# Altium footprint library mastermind.PCBLIB: 1061 footprints (part 44 of 67)
Each footprint in its own frame and in the unit in brackets; x right, y up, seen from the top. Pads: shape width x height; smd on the part's side, far side on the other; paste and mask are expansions set on the pad; w line width, h text height; cw(c..) or ccw(c..) is an arc to the next point about the centre after c.
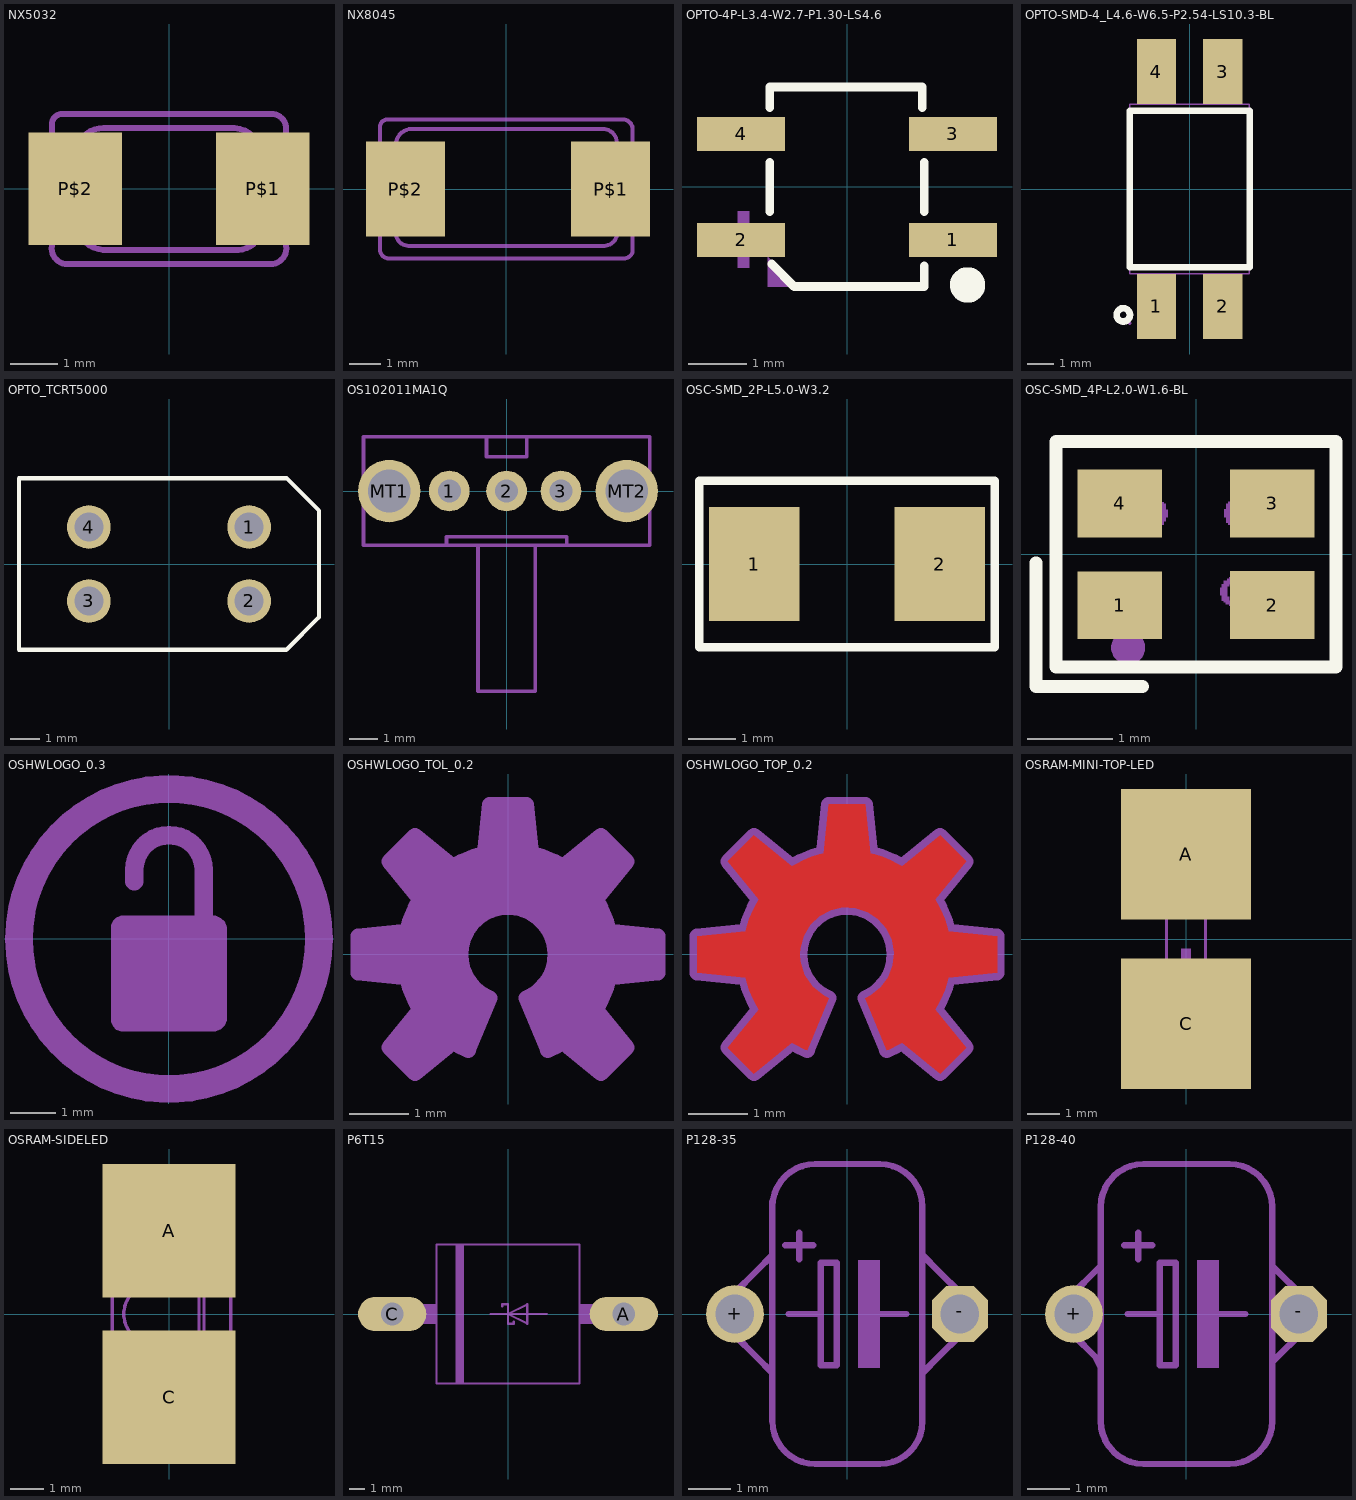
[diagram p43: the footprints below, top view; thin cyan lines are the x and y axes]

## NX5032 [mm]
pads (2):
  rect 2x2.4 smd: P$1(2,0) P$2(-2,0)
Mechanical 2:
  lines w0.127: -2.5,-1.217 ccw(c-2.167,-1.267) -2.217,-1.6 2.217,-1.6 ccw(c2.167,-1.267) 2.5,-1.217 2.5,1.284 ccw(c2.184,1.284) 2.184,1.6 -2.276,1.6 ccw(c-2.276,1.376) -2.5,1.376 -2.5,-1.217 ; -2,-0.7 ccw(c-1.35,-0.65) -1.3,-1.3 1.4,-1.3 ccw(c1.45,-0.75) 2,-0.8 2,0.6 ccw(c1.35,0.65) 1.4,1.3 -1.4,1.3 ccw(c-1.4,0.7) -2,0.7 -2,-0.7

## NX8045 [mm]
pads (2):
  rect 2.5x3 smd: P$1(3.3,0) P$2(-3.2,0)
Mechanical 2:
  lines w0.127: -4,-1.917 ccw(c-3.717,-1.917) -3.717,-2.2 3.717,-2.2 ccw(c3.717,-1.917) 4,-1.917 4,1.884 ccw(c3.684,1.884) 3.684,2.2 -3.776,2.2 ccw(c-3.776,1.976) -4,1.976 -4,-1.917 ; -3.5,-1.4 ccw(c-3.1,-1.4) -3.1,-1.8 3.1,-1.8 ccw(c3.1,-1.4) 3.5,-1.4 3.5,1.4 ccw(c3.05,1.45) 3.1,1.9 -3,1.9 ccw(c-3,1.4) -3.5,1.4 -3.5,-1.4

## OPTO-4P-L3.4-W2.7-P1.30-LS4.6 [mm]
pads (4):
  rect 1.5x0.58 smd paste+0 mask+0.051: 1(1.8,-0.9) 2(-1.8,-0.9) 3(1.8,0.9) 4(-1.8,0.9)
Top Overlay:
  lines w0.15: -1.312,-0.416 -1.312,0.416 ; -1.312,1.344 -1.312,1.696 1.28,1.696 1.28,1.344 ; -1.28,-1.312 -0.896,-1.696 -0.8,-1.696 1.312,-1.696 1.312,-1.344 ; 1.312,-0.416 1.312,0.416
  lines w0.4: 2.048,-1.568 ccw(c2.049,-1.668) 2.051,-1.568
Mechanical 15:
  region: -1.344,-1.184 -1.344,-1.696 -0.832,-1.696
  region: 1.36,-0.8 1.36,-0.992 2.32,-0.992 2.32,-0.8
  region: -1.856,-1.376 -1.664,-1.376 -1.664,-0.416 -1.856,-0.416
  region: -2.24,-0.8 -2.24,-0.992 -1.28,-0.992 -1.28,-0.8

## OPTO-SMD-4_L4.6-W6.5-P2.54-LS10.3-BL [mm]
pads (4):
  rect 1.5x2.5 smd paste+0 mask+0.051: 1(-1.27,-4.5) 2(1.27,-4.5) 3(1.27,4.5) 4(-1.27,4.5)
Top Overlay:
  circle w0.254: c-2.54,-4.826 r0.254
  lines w0.254: -2.3,-3 2.3,-3 2.3,3 -2.3,3 -2.3,-3
Mechanical 6:
  circle w0.6: c-1.397,-4.969 r0.3
Mechanical 15:
  region: -1.995,-5.15 -1.995,-4.55 -0.545,-4.55 -0.545,-5.15
  region: -1.995,-4.56 -1.995,-3.24 -0.545,-3.24 -0.545,-4.56
  region: 0.545,-5.15 0.545,-4.55 1.995,-4.55 1.995,-5.15
  region: 0.545,-4.56 0.545,-3.24 1.995,-3.24 1.995,-4.56
  region: 0.545,4.55 0.545,5.15 1.995,5.15 1.995,4.55
  region: 0.545,3.24 0.545,4.56 1.995,4.56 1.995,3.24
  region: -1.995,4.55 -1.995,5.15 -0.545,5.15 -0.545,4.55
  region: -1.995,3.24 -1.995,4.56 -0.545,4.56 -0.545,3.24
  region: -2.23,-5.15 -2.231,-5.126 -2.266,-5.091 -2.315,-5.091 -2.35,-5.126 -2.35,-5.15 -2.349,-5.175 -2.314,-5.209 -2.266,-5.209 -2.231,-5.175
  lines w0.051: -2.29,-3.25 2.29,-3.25 2.29,3.25 -2.29,3.25 -2.29,-3.25
3D body "PC817S.STEP": height 3.75, standoff 0.12, extent -2.3,-5.089 2.3,5.089

## OPTO_TCRT5000 [mm]
pads (4):
  round 1.5 hole 1: 1(2.75,1.27) 2(2.75,-1.27) 3(-2.75,-1.27) 4(-2.75,1.27)
Top Overlay:
  lines w0.152: -5.15,-2.95 4.023,-2.95 5.15,-1.823 5.15,1.835 4.035,2.95 -5.15,2.95 -5.15,-2.95

## OS102011MA1Q [mil]
pads (5):
  round 56 hole 31.5: 1(-78.74,0) 2(0,0) 3(74.8,0)
  round 86 hole 59.06: MT1(-161.42,0) MT2(165.35,0)
Mechanical 2:
  lines w5: -82.68,-74.8 -39.37,-74.8 ; -82.68,-74.8 -196.85,-74.8 -196.85,74.8 -27.56,74.8 ; -82.68,-74.8 -82.68,-62.99 82.68,-62.99 82.68,-74.8 ; -39.37,-74.8 39.37,-74.8 ; -39.37,-74.8 -39.37,-275.59 39.37,-275.59 39.37,-74.8 ; -27.56,74.8 27.56,74.8 ; -27.56,74.8 -27.56,47.24 27.56,47.24 27.56,74.8 ; 27.56,74.8 196.85,74.8 196.85,-74.8 82.68,-74.8 ; 39.37,-74.8 82.68,-74.8

## OSC-SMD_2P-L5.0-W3.2 [mm]
pads (2):
  rect 1.9x2.4 smd paste+0 mask+0.051: 1(-1.95,0) 2(1.95,0)
Top Overlay:
  lines w0.18: -3.099,-1.75 3.099,-1.75 3.099,1.75 -3.099,1.75 -3.099,1.4 -3.099,-1.75

## OSC-SMD_4P-L2.0-W1.6-BL [mm]
pads (4):
  rect 1x0.8 smd: 1(-0.9,-0.6) 2(0.9,-0.6) 3(0.9,0.6) 4(-0.9,0.6)
Top Overlay:
  lines w0.152: -1.887,-0.1 -1.887,-1.557 -0.63,-1.557 ; -1.651,-1.328 -1.529,-1.328 1.651,-1.328 1.651,1.328 -1.651,1.328 -1.651,-1.328
Mechanical 15:
  drawing of 242 lines, arcs and shapes, not listed

## OSHWLOGO_0.3 [mm]
Mechanical 8:
  circle w0.61: c0,0 r3.302
  region: 1.27,-1.727 1.27,-1.788 1.224,-1.9 1.138,-1.986 1.026,-2.032 0.965,-2.032 -1.016,-2.032 -1.067,-2.032 -1.16,-1.993 -1.231,-1.922 -1.27,-1.829 -1.27,-1.778 -1.27,0.254 -1.27,0.305 -1.231,0.398 -1.16,0.469 -1.067,0.508 -1.016,0.508 0.965,0.508 1.026,0.508 1.138,0.462 1.224,0.376 1.27,0.264 1.27,0.203
  lines w0.406: -0.762,1.27 -0.762,1.524 cw(c0,1.524) 0,2.286 cw(c0,1.524) 0.762,1.524 0.762,0.508

## OSHWLOGO_TOL_0.2 [mm]
Mechanical 8:
  region: 0.668,-1.613 0.702,-1.6 0.767,-1.569 0.832,-1.536 0.895,-1.5 0.925,-1.481 1.564,-2.002 2.002,-1.564 1.481,-0.925 1.519,-0.864 1.586,-0.735 1.641,-0.601 1.685,-0.463 1.702,-0.393 2.521,-0.31 2.521,0.31 1.702,0.393 1.685,0.463 1.641,0.601 1.586,0.735 1.519,0.864 1.481,0.925 2.002,1.564 1.564,2.002 0.925,1.481 0.864,1.519 0.735,1.586 0.601,1.641 0.463,1.685 0.393,1.702 0.31,2.521 -0.31,2.521 -0.393,1.702 -0.463,1.685 -0.601,1.641 -0.735,1.586 -0.864,1.519 -0.925,1.481 -1.564,2.002 -2.002,1.564 -1.481,0.925 -1.519,0.864 -1.586,0.735 -1.641,0.601 -1.685,0.463 -1.702,0.393 -2.521,0.31 -2.521,-0.31 -1.702,-0.393 -1.685,-0.463 -1.641,-0.601 -1.586,-0.735 -1.519,-0.864 -1.481,-0.925 -2.002,-1.564 -1.564,-2.002 -0.925,-1.481 -0.895,-1.5 -0.832,-1.536 -0.767,-1.569 -0.702,-1.6 -0.668,-1.613 -0.304,-0.733 -0.408,-0.681 -0.588,-0.533 -0.718,-0.339 -0.785,-0.116 -0.794,0 -0.787,0.107 -0.73,0.313 -0.62,0.496 -0.465,0.643 -0.277,0.744 -0.068,0.791 0.145,0.78 0.348,0.713 0.526,0.595 0.665,0.433 0.757,0.24 0.793,0.029 0.772,-0.183 0.695,-0.383 0.568,-0.554 0.4,-0.686 0.304,-0.733
  lines w0.254: -2.521,-0.31 -1.702,-0.393 ccw(c0,0) -1.481,-0.925 -2.002,-1.564 -1.564,-2.002 -0.925,-1.481 ccw(c0.001,0) -0.668,-1.613 -0.304,-0.733 cw(c0,0) -0.794,0 cw(c0,0) 0.304,-0.733 0.668,-1.613 ccw(c-0.001,0) 0.925,-1.481 1.564,-2.002 2.002,-1.564 1.481,-0.925 ccw(c0,0) 1.702,-0.393 2.521,-0.31 2.521,0.31 1.702,0.393 ccw(c0,0) 1.481,0.925 2.002,1.564 1.564,2.002 0.925,1.481 ccw(c0,0) 0.393,1.702 0.31,2.521 -0.31,2.521 -0.393,1.702 ccw(c0,0) -0.925,1.481 -1.564,2.002 -2.002,1.564 -1.481,0.925 ccw(c0,0) -1.702,0.393 -2.521,0.31 -2.521,-0.31

## OSHWLOGO_TOP_0.2 [mm]
Top Layer:
  region: 0.668,-1.613 0.702,-1.6 0.767,-1.569 0.832,-1.536 0.895,-1.5 0.925,-1.481 1.564,-2.002 2.002,-1.564 1.481,-0.925 1.519,-0.864 1.586,-0.735 1.641,-0.601 1.685,-0.463 1.702,-0.393 2.521,-0.31 2.521,0.31 1.702,0.393 1.685,0.463 1.641,0.601 1.586,0.735 1.519,0.864 1.481,0.925 2.002,1.564 1.564,2.002 0.925,1.481 0.864,1.519 0.735,1.586 0.601,1.641 0.463,1.685 0.393,1.702 0.31,2.521 -0.31,2.521 -0.393,1.702 -0.463,1.685 -0.601,1.641 -0.735,1.586 -0.864,1.519 -0.925,1.481 -1.564,2.002 -2.002,1.564 -1.481,0.925 -1.519,0.864 -1.586,0.735 -1.641,0.601 -1.685,0.463 -1.702,0.393 -2.521,0.31 -2.521,-0.31 -1.702,-0.393 -1.685,-0.463 -1.641,-0.601 -1.586,-0.735 -1.519,-0.864 -1.481,-0.925 -2.002,-1.564 -1.564,-2.002 -0.925,-1.481 -0.895,-1.5 -0.832,-1.536 -0.767,-1.569 -0.702,-1.6 -0.668,-1.613 -0.304,-0.733 -0.408,-0.681 -0.588,-0.533 -0.718,-0.339 -0.785,-0.116 -0.794,0 -0.787,0.107 -0.73,0.313 -0.62,0.496 -0.465,0.643 -0.277,0.744 -0.068,0.791 0.145,0.78 0.348,0.713 0.526,0.595 0.665,0.433 0.757,0.24 0.793,0.029 0.772,-0.183 0.695,-0.383 0.568,-0.554 0.4,-0.686 0.304,-0.733
Mechanical 8:
  lines w0.254: -2.521,-0.31 -2.521,0.31 -1.702,0.393 cw(c0,0) -1.481,0.925 -2.002,1.564 -1.564,2.002 -0.925,1.481 cw(c0,0) -0.393,1.702 -0.31,2.521 0.31,2.521 0.393,1.702 cw(c0,0) 0.925,1.481 1.564,2.002 2.002,1.564 1.481,0.925 cw(c0,0) 1.702,0.393 2.521,0.31 2.521,-0.31 1.702,-0.393 cw(c0,0) 1.481,-0.925 2.002,-1.564 1.564,-2.002 0.925,-1.481 cw(c-0.001,0) 0.668,-1.613 0.304,-0.733 ccw(c0,0) -0.794,0 ccw(c0,0) -0.304,-0.733 -0.668,-1.613 cw(c0.001,0) -0.925,-1.481 -1.564,-2.002 -2.002,-1.564 -1.481,-0.925 cw(c0,0) -1.702,-0.393 -2.521,-0.31

## OSRAM-MINI-TOP-LED [mm]
pads (2):
  rect 4x4 smd paste-2 mask-2: A(0,2.6) C(0,-2.6)
Top Paste:
  region: -0.45,-1.35 -0.45,-0.65 0.45,-0.65 0.45,-1.35
  region: -0.45,0.65 -0.45,1.35 0.45,1.35 0.45,0.65
  region: -0.5,-1.4 -0.5,-0.6 0.5,-0.6 0.5,-1.4
  region: -0.5,0.6 -0.5,1.4 0.5,1.4 0.5,0.6
Mechanical 8:
  region: -0.15,-0.6 -0.15,-0.3 0.15,-0.3 0.15,-0.6
  lines w0.102: -0.45,0.95 -0.45,1.1 0.45,1.1 0.45,0.95 ; 0.45,-0.95 0.45,-1.1 -0.45,-1.1 -0.45,-0.9 -0.4,-0.9 ; -0.4,-0.9 -0.6,-0.7 -0.6,0.9 0.6,0.9 0.6,-0.9 -0.4,-0.9

## OSRAM-SIDELED [mm]
pads (2):
  rect 4x4 smd paste-2 mask-2: A(0,2.5) C(0,-2.5)
Top Paste:
  region: -1.9,-2.1 -1.9,-0.6 1.9,-0.6 1.9,-2.1
  region: -1.9,0.6 -1.9,2.1 1.9,2.1 1.9,0.6
Top Solder:
  region: -2.1,-2.2 -2.1,-0.4 2.1,-0.4 2.1,-2.2
  region: -2.1,0.4 -2.1,2.2 2.1,2.2 2.1,0.4
Mechanical 8:
  region: -1.85,-2.05 -1.85,-1 -0.7,-1 -0.7,-2.05
  lines w0.102: 0.85,-1.2 -0.55,-0.9 cw(c-0.45,0) -0.55,0.9 0.85,1.2 ; 0.9,-2.05 0.9,2.05 ; 0.9,-2.05 -1.85,-2.05 -1.85,-0.75 -1.7,-0.75 -1.7,0.75 -1.85,0.75 -1.85,2.05 0.9,2.05 ; 0.9,-2.05 1.05,-2.05 ; 0.9,2.05 1.05,2.05 ; 1.05,-2.05 1.85,-1.85 1.85,1.85 1.05,2.05 ; 1.05,-2.05 1.05,2.05

## P6T15 [mil]
pads (2):
  oval 177x88.5 hole 59: A(300,0) C(-300,0)
Mechanical 2:
  region: -235,-25 -235,25 -185,25 -185,-25
  region: 185,-25 185,25 235,25 235,-25
  region: -135,-180 -135,180 -115,180 -115,-180
  lines w6: -45,0 0,0 ; -15,20 -15,25 0,25 0,0 ; 15,-20 15,-25 0,-25 0,0 ; 100,0 0,0 ; 0,0 50,-25 50,25 0,0 ; -185,-180 185,-180 185,180 -185,180 -185,-180
Mechanical 8:
  lines w50: -300,0 -245,0 ; 245,0 300,0

## P128-35 [mil]
pads (2):
  round 54 hole 36: +(-105,0)
  oct 52.29x52.29 hole 36: -(105,0)
Mechanical 2:
  region: 10,-50 10,50 30,50 30,-50
  lines w6: -85,-40 -70,-55 ; -85,40 -70,55 ; -70,-25 -70,-55 ; -70,25 -70,55 ; -70,100 cw(c-30,100) -30,140 30,140 cw(c30,100) 70,100 70,55 ; -70,105 -70,55 ; -58,64 -32,64 ; -55,0 -25,0 ; -45,51 -45,76 ; 25,0 55,0 ; 70,-25 70,-55 ; 70,25 70,55 ; 85,-40 70,-55 ; 85,40 70,55 ; -70,-55 -70,-100 ccw(c-30,-100) -30,-140 30,-140 ccw(c30,-100) 70,-100 70,-55 ; -25,0 -25,48 -10,48 -10,-48 -25,-48 -25,0
Mechanical 8:
  lines w6: -85,-40 -105,-20 cw(c-105,0) -105,20 -85,40 ; -70,-25 -70,25 ; 70,-25 70,25 ; 85,-40 105,-20 ccw(c105,0) 105,20 85,40

## P128-40 [mil]
pads (2):
  round 54 hole 36: +(-105,0)
  oct 52.29x52.29 hole 36: -(105,0)
Mechanical 2:
  region: 10,-50 10,50 30,50 30,-50
  lines w6: -85,-40 -80,-50 ; -85,40 -80,45 ; -80,-30 -80,-50 ; -80,30 -80,45 ; -58,64 -32,64 ; -55,0 -25,0 ; -45,51 -45,76 ; 25,0 55,0 ; 80,-30 80,-45 ; 80,30 80,45 ; 85,-40 80,-45 ; 85,40 80,45 ; -80,-50 -80,-100 ccw(c-40,-100) -40,-140 40,-140 ccw(c40,-100) 80,-100 80,-45 ; -80,45 -80,100 cw(c-40,100) -40,140 40,140 cw(c40,100) 80,100 80,45 ; -25,0 -25,-48 -10,-48 -10,48 -25,48 -25,0
Mechanical 8:
  lines w6: -85,-40 -105,-20 cw(c-105,0) -105,20 -85,40 ; -80,-30 -80,30 ; 80,-30 80,30 ; 85,-40 105,-20 ccw(c105,0) 105,20 85,40